# Altium footprint library Atlan.PcbLib: 283 footprints (part 11 of 18)
Each footprint in its own frame and in the unit in brackets; x right, y up, seen from the top. Pads: shape width x height; smd on the part's side, far side on the other; paste and mask are expansions set on the pad; w line width, h text height; cw(c..) or ccw(c..) is an arc to the next point about the centre after c.
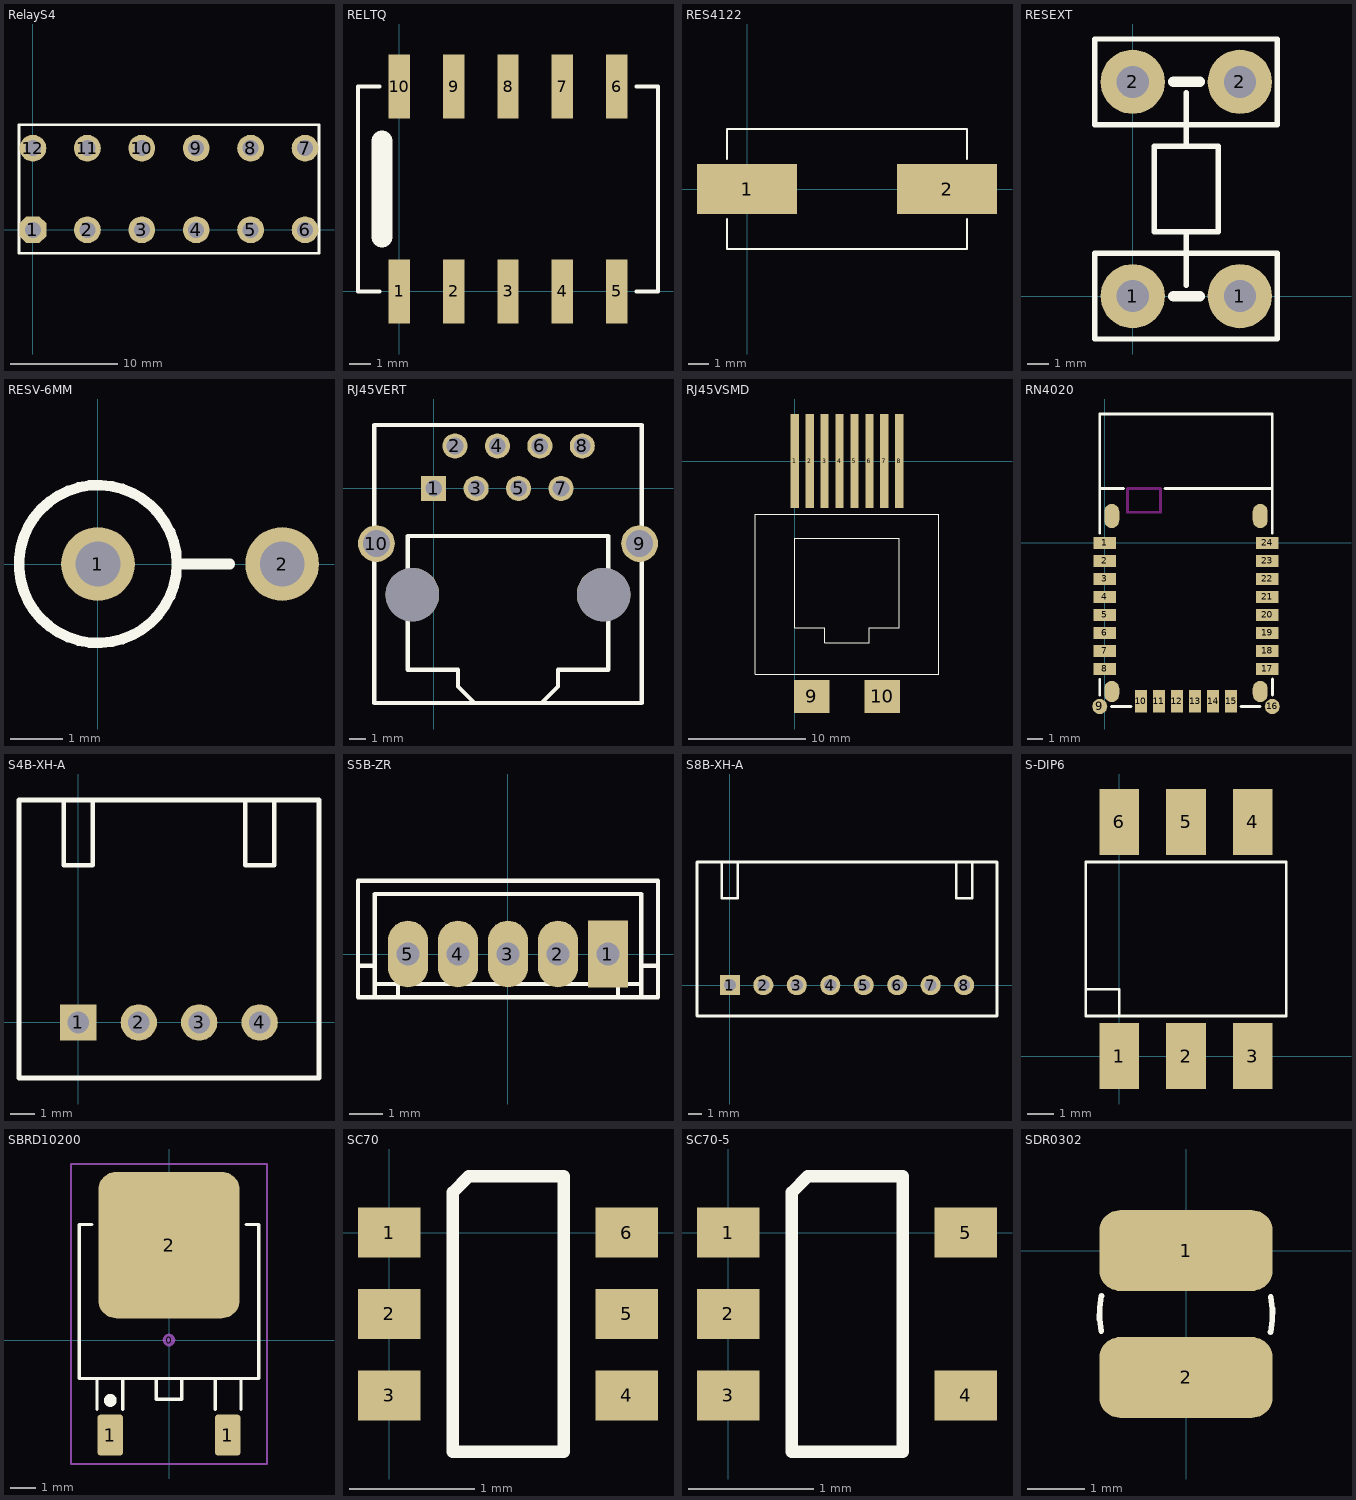
[diagram p10: the footprints below, top view; thin cyan lines are the x and y axes]

## RelayS4 [mm]
pads (12):
  oct 2.5x2.5 hole 1.5: 1(0,0)
  round 2.5 hole 1.5: 2(5.08,0) 3(10.16,0) 4(15.24,0) 5(20.32,0) 6(25.4,0) 7(25.4,7.62) 8(20.32,7.62) 9(15.24,7.62) 10(10.16,7.62) 11(5.08,7.62) 12(0,7.62)
Top Overlay:
  lines w0.25: 12.67,9.81 26.67,9.81 ; 12.7,9.81 -1.3,9.81 -1.3,3.81 -1.3,-2.19 12.7,-2.19 26.7,-2.19 26.7,9.81
3D body: height 10, standoff 0, extent -1.3,-2.19 26.7,9.81

## RELTQ [mm] "Relay TQ Series"
pads (10):
  rect 1x3 smd: 1(0,0) 2(2.54,0) 3(5.08,0) 4(7.62,0) 5(10.16,0) 6(10.16,9.56) 7(7.62,9.56) 8(5.08,9.56) 9(2.54,9.56) 10(0,9.56)
Top Overlay:
  lines w0.2: -0.92,0 -1.92,0 -1.92,9.56 -0.92,9.56 ; 11.08,0 12.08,0 12.08,9.56 11.08,9.56
  lines w1: -0.8,2.54 -0.8,7.02
3D body: height 5.6, standoff 0, extent -1.9,0 12.1,9.6

## RES4122 [mm]
pads (2):
  rect 5x2.5 smd: 1(0,0) 2(10,0)
Top Overlay:
  lines w0.1: -1,-1.5 -1,-3 11,-3 11,-1.5 ; -1,1.5 -1,3 11,3 11,1.5
3D body: height 5, standoff 0, extent -1,-3 11,3

## RESEXT [mm]
pads (4):
  round 3 hole 1.5: 1(0,0) 1(5,0) 2(0,10) 2(5,10)
Top Overlay:
  lines w0.25: 2.5,0.5 2.5,3 ; 2.5,7 2.5,9.5 ; 1,3 4,3 4,7 1,7 1,3
  lines w0.254: -1.775,-2 -1.775,2 6.75,2 6.75,-2 -1.775,-2 ; -1.775,8 -1.775,12 6.75,12 6.75,8 -1.775,8
  lines w0.5: 1.9,0 3.125,0 ; 1.9,10 3.125,10
3D body "Faston PCB TAB 4_8x0_8x13_5.STEP": height 9, standoff -4.8, extent -0.65,9.6 5.65,10.4
3D body "Faston PCB TAB 4_8x0_8x13_5.STEP": height 9, standoff -4.8, extent -0.65,-0.4 5.65,0.4

## RESV-6MM [mm]
pads (2):
  round 1.4 hole 0.85: 1(0,0) 2(3.5,0)
Top Overlay:
  circle w0.2: c0,0 r1.5
  lines w0.2: 1.5,0 2.5,0
3D body: height 12, standoff 1, extent -1.5,-1.5 1.488,1.494

## RJ45VERT [mm]
pads (12):
  rect 1.5x1.5 hole 1: 1(0,0)
  round 1.5 hole 1: 2(1.27,2.54) 3(2.54,0) 4(3.81,2.54) 5(5.08,0) 6(6.35,2.54) 7(7.62,0) 8(8.89,2.54)
  round 2.2 hole 1.6: 9(12.32,-3.3) 10(-3.43,-3.3)
  round 3.2 hole 3.2 unplated: ""(-1.27,-6.35) ""(10.16,-6.35)
Top Overlay:
  lines w0.25: -3.555,-12.849 -3.555,3.801 12.445,3.801 12.445,-12.849 -3.555,-12.849 ; -1.555,-10.849 -1.555,-2.849 10.445,-2.849 10.445,-10.849 7.445,-10.849 7.445,-11.849 6.445,-12.849 2.445,-12.849 1.445,-11.849 1.445,-10.849 -1.555,-10.849
3D body: height 16.4, standoff 0, extent -3.555,-12.849 12.445,3.801

## RJ45VSMD [mm]
pads (10):
  rect 0.7x8 smd: 1(0,0) 2(1.27,0) 3(2.54,0) 4(3.81,0) 5(5.08,0) 6(6.35,0) 7(7.62,0) 8(8.89,0)
  rect 3x2.8 smd: 9(1.445,-20.01) 10(7.445,-20.01)
Top Overlay:
  lines w0.1: -3.35,-18.11 -3.35,-4.51 12.25,-4.51 12.25,-18.11 -3.35,-18.11 ; 0,-14.17 0,-6.55 8.89,-6.55 8.89,-14.17 6.35,-14.17 6.35,-15.44 2.54,-15.44 2.54,-14.17 0,-14.17

## RN4020 [mm]
pads (28):
  rect 1.5x0.8 smd: 1(0,0) 2(0,-1.2) 3(0,-2.4) 4(0,-3.6) 5(0,-4.8) 6(0,-6) 7(0,-7.2) 8(0,-8.4) 17(10.8,-8.4) 18(10.8,-7.2) 19(10.8,-6) 20(10.8,-4.8) 21(10.8,-3.6) 22(10.8,-2.4) 23(10.8,-1.2) 24(10.8,0)
  round 1 smd: 9(-0.35,-10.9) 16(11.15,-10.9)
  rect 0.8x1.5 smd: 10(2.4,-10.55) 11(3.6,-10.55) 12(4.8,-10.55) 13(6,-10.55) 14(7.2,-10.55) 15(8.4,-10.55)
  oval 1x1.4 smd: ""(0.45,-9.9) ""(10.35,-9.9)
  oval 1x1.6 smd: ""(0.45,1.8) ""(10.35,1.8)
Top Overlay:
  lines w0.2: -0.35,-10.125 -0.35,-9.1 ; -0.35,0.675 -0.35,8.6 11.15,8.6 11.15,0.675 ; -0.35,3.65 1.25,3.65 ; 0.425,-10.9 1.725,-10.9 ; 4,3.65 11.15,3.65 ; 9.075,-10.9 10.35,-10.9 ; 11.175,-10.125 11.175,-9.075
Keep-Out Layer:
  lines w0.2: 1.5,2.05 1.5,3.65 3.7,3.65 3.7,2.05 1.5,2.05
3D body: height 1.5, standoff 0, extent -0.4,-10.9 11.2,8.6

## S4B-XH-A [mm] "Side entry connector"
height 6.1
pads (4):
  rect 1.5x1.5 hole 0.9: 1(0,0)
  round 1.5 hole 0.9: 2(2.5,0) 3(5,0) 4(7.5,0)
Top Overlay:
  lines w0.2: -0.6,9.2 -0.6,6.5 0.6,6.5 0.6,9.2 ; 6.9,9.2 6.9,6.5 8.1,6.5 8.1,9.2 ; -2.45,-2.3 -2.45,9.2 9.95,9.2 9.95,-2.3 -2.45,-2.3

## S5B-ZR [mm]
pads (5):
  rect 1.2x2 hole 0.7: 1(3,0)
  oval 1.2x2 hole 0.7: 2(1.5,0) 3(0,0) 4(-1.5,0) 5(-3,0)
Top Overlay:
  lines w0.127: -4.5,-0.35 -4,-0.35 ; -4,-1.3 -4,1.8 4,1.8 4,-1.3 ; -4,-0.9 4,-0.9 ; -3.3,-1.3 -3.3,-0.9 ; 3.3,-1.3 3.3,-0.9 ; 4,-0.35 4.5,-0.35 ; -4.5,-1.3 -4.5,2.2 4.5,2.2 4.5,-1.3 -4.5,-1.3
3D body "B5B-ZR.STEP": height 4.5, standoff -2.7, extent -4.5,-1.3 4.5,2.2

## S8B-XH-A [mm] "Side entry connector"
height 6.1
pads (8):
  rect 1.5x1.5 hole 0.9: 1(0,0)
  round 1.5 hole 0.9: 2(2.5,0) 3(5,0) 4(7.5,0) 5(10,0) 6(12.5,0) 7(15,0) 8(17.5,0)
Top Overlay:
  lines w0.2: -0.6,9.2 -0.6,6.5 0.6,6.5 0.6,9.2 ; 16.9,9.2 16.9,6.5 18.1,6.5 18.1,9.2 ; -2.45,-2.3 -2.45,9.2 19.95,9.2 19.95,-2.3 -2.45,-2.3

## S-DIP6 [mm]
pads (6):
  rect 1.5x2.5 smd: 1(0,0) 2(2.54,0) 3(5.08,0) 4(5.08,8.89) 5(2.54,8.89) 6(0,8.89)
Top Overlay:
  lines w0.1: -1.27,2.54 0,2.54 0,1.524 ; -1.27,1.524 6.35,1.524 6.35,7.366 -1.27,7.366 -1.27,1.524

## SBRD10200 [mm] "SCHOTTKY RECTIFIER TO-252"
height 2.38
pads (4):
  round 0.5 on Mech15: 0(0,0)
  rrect25% 1x1.6 smd: 1(-2.285,-3.7) 1(2.285,-3.7)
  rrect25% 5.5x5.7 smd: 2(0,3.7)
Top Overlay:
  circle w0.25: c-2.285,-2.35 r0.125
  lines w0.127: -3,4.5 -3.5,4.5 -3.5,-1.5 3.5,-1.5 3.5,4.5 3,4.5 ; -2.8,-2.7 -2.8,-1.5 -1.8,-1.5 -1.8,-2.7 ; 1.8,-2.7 1.8,-1.5 2.8,-1.5 2.8,-2.7 ; -0.5,-2.3 -0.5,-1.5 0.5,-1.5 0.5,-2.3 -0.5,-2.3
Mechanical 15:
  lines w0.076: -3.81,-4.826 -3.81,6.858 3.81,6.858 3.81,-4.826 -3.81,-4.826
3D body "DPAK.stp": height 2.31, standoff 0, extent -3.3,-3.951 3.3,5.762

## SC70 [mm]
pads (6):
  rect 0.5x0.4 smd: 1(0,0) 2(0,-0.65) 3(0,-1.3) 4(1.9,-1.3) 5(1.9,-0.65) 6(1.9,0)
Top Overlay:
  lines w0.1: 0.508,-1.75 0.508,0.323 0.635,0.45 1.397,0.45 1.397,-1.75 0.508,-1.75

## SC70-5 [mm]
pads (5):
  rect 0.5x0.4 smd: 1(0,0) 2(0,-0.65) 3(0,-1.3) 4(1.9,-1.3) 5(1.9,0)
Top Overlay:
  lines w0.1: 0.508,-1.75 1.397,-1.75 1.397,0.45 0.635,0.45 0.508,0.323 0.508,-1.75
3D body: height 0.9, standoff 0, extent 0.5,-1.75 1.4,0.45

## SDR0302 [mm]
height 2.5
pads (2):
  rrect50% 3x1.4 smd: 1(0,0) 2(0,-2.2)
Top Overlay:
  lines w0.1: -1.471,-1.394 cw(c0,-1.1) -1.467,-0.786 ; 1.467,-1.414 ccw(c0,-1.1) 1.471,-0.806
3D body: height 2.5, standoff 0, extent -1.5,-2.6 1.488,0.394